# Altium footprint library AD_Lib.PcbLib: 508 footprints (part 7 of 32)
Each footprint in its own frame and in the unit in brackets; x right, y up, seen from the top. Pads: shape width x height; smd on the part's side, far side on the other; paste and mask are expansions set on the pad; w line width, h text height; cw(c..) or ccw(c..) is an arc to the next point about the centre after c.
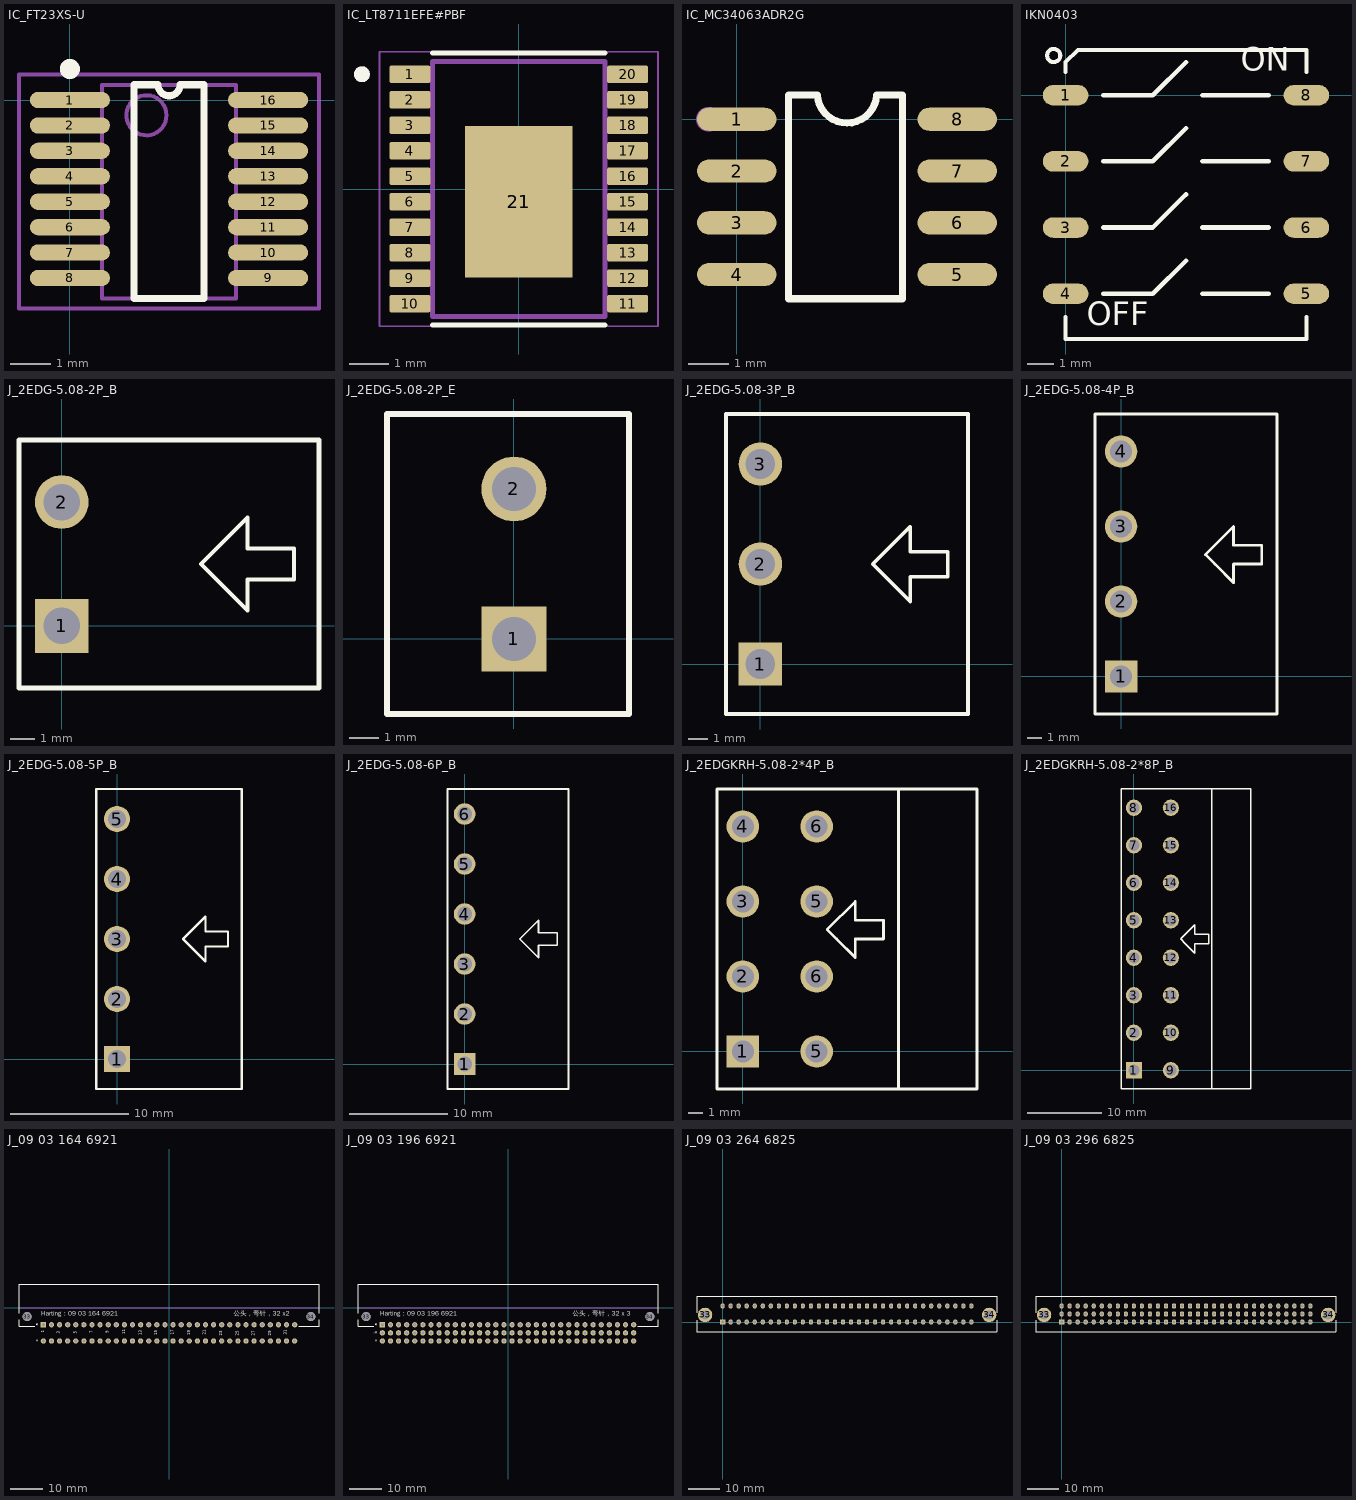
[diagram p6: the footprints below, top view; thin cyan lines are the x and y axes]

## IC_FT23XS-U [mil] "SOP, 16-Leads, Body 4.90x3.91mm, Pitch 0.635mm"
height 53
pads (16):
  oval 78.74x16 smd: 1(0,0) 2(0,-25) 3(0,-50) 4(0,-75) 5(0,-100) 6(0,-125) 7(0,-150) 8(0,-175) 9(195,-175) 10(195,-150) 11(195,-125) 12(195,-100) 13(195,-75) 14(195,-50) 15(195,-25) 16(195,0)
Top Overlay:
  circle w9.84: c0,30.51 r4.92
  lines w7: 62.99,-195 62.99,15 86.69,15 ccw(c97.52,15) 108.35,15 132.01,15 132.01,-195 62.99,-195
Mechanical 13:
  circle w3.94: c75.31,-15 r19.68
  lines w3.94: 31.5,-195 163.5,-195 163.5,15 31.5,15 31.5,-195
Mechanical 15:
  lines w3.94: -50,-205 -50,25 245,25 245,-205 -50,-205
3D body: height 78.35, standoff 0, extent 31.5,-195 164.88,15

## IC_LT8711EFE#PBF [mm] "FE Package 20-Lead Plastic TSSOP (4.4mm)"
height 1.2
pads (21):
  rrect25% 1.05x0.45 smd: 1(-2.775,2.925) 2(-2.775,2.275) 3(-2.775,1.625) 4(-2.775,0.975) 5(-2.775,0.325) 6(-2.775,-0.325) 7(-2.775,-0.975) 8(-2.775,-1.625) 9(-2.775,-2.275) 10(-2.775,-2.925) 11(2.775,-2.925) 12(2.775,-2.275) 13(2.775,-1.625) 14(2.775,-0.975) 15(2.775,-0.325) 16(2.775,0.325) 17(2.775,0.975) 18(2.775,1.625) 19(2.775,2.275) 20(2.775,2.925)
  rect 2.74x3.86 smd paste-3: 21(0,-0.325)
Top Overlay:
  circle w0.2: c-4,2.925 r0.1
  lines w0.127: -2.2,-3.47 2.2,-3.47 ; -2.2,3.47 2.2,3.47
Top Paste:
  region: 0.96,-1.36 -0.96,-1.36 -0.96,1.36 0.96,1.36
Mechanical 13:
  circle w0.2: c-4,2.925 r0.1
  lines w0.127: -2.2,-3.25 -2.2,3.25 2.2,3.25 2.2,-3.25 -2.2,-3.25
Mechanical 15:
  lines w0.05: -3.55,-3.5 -3.55,3.5 3.55,3.5 3.55,-3.5 -3.55,-3.5
3D body "step_temp.STEP": height 1.2, standoff 0, extent -3.2,-3.25 3.2,3.25

## IC_MC34063ADR2G [mil] "宽体SO8,体宽150mil"
height 68.9
pads (8):
  oval 76.78x22.38 smd: 1(0,0) 2(0,-50) 3(0,-100) 4(0,-150) 5(213,-150) 6(213,-100) 7(213,-50) 8(213,0)
Top Overlay:
  lines w7: 77.89,23.43 50,23.43 50,-173.43 160,-173.43 160,23.43 135.09,23.43 ; 77.89,23.43 ccw(c106.5,24.99) 135.09,23.23
Mechanical 15:
  circle w11.81: c-27.36,0 r5.91

## IKN0403 [mil] "Apem之IKN系列播码开关，4bit"
height 59.06
pads (8):
  oval 69x31 smd: 1(0,0) 2(0,-100) 3(0,-200) 4(0,-300) 5(364,-300) 6(364,-200) 7(364,-100) 8(364,0)
Top Overlay:
  circle w6: c-18,60 r10
  lines w6: 0,-335 0,-368.5 364,-368.5 364,-335 ; 0,35 0,50 18.5,68.5 364,68.5 364,35
  lines w7: 57,-300 132,-300 182,-250 ; 57,-200 132,-200 182,-150 ; 57,-100 132,-100 182,-50 ; 57,0 132,0 182,50 ; 207,-300 307,-300 ; 207,-200 307,-200 ; 207,-100 307,-100 ; 207,0 307,0
  text "ON" at 265,25 h60
  text "OFF" at 32,-360 h60

## J_2EDG-5.08-2P_B [mm] "2EDG-5.08插拔式接线端子，弯针座；（凤凰端子）"
height 10
pads (2):
  rect 2.2x2.2 hole 1.5: 1(0,0)
  round 2.2 hole 1.5: 2(0,5.08)
Top Overlay:
  lines w0.178: 5.715,2.54 7.62,4.445 7.62,3.175 9.525,3.175 9.525,1.905 7.62,1.905 7.62,0.635 6.35,1.905 5.715,2.54
  lines w0.203: -1.75,-2.54 -1.75,7.62 10.55,7.62 10.55,-2.54 -1.75,-2.54

## J_2EDG-5.08-2P_E [mm] "2EDG-5.08插拔式接线端子，直针座；（凤凰端子）"
height 10
pads (2):
  rect 2.2x2.2 hole 1.5: 1(0,0)
  round 2.2 hole 1.5: 2(0,5.08)
Top Overlay:
  lines w0.203: -4.3,-2.54 3.9,-2.54 3.9,7.62 -4.3,7.62 -4.3,-2.54

## J_2EDG-5.08-3P_B [mm] "2EDG-5.08插拔式接线端子，弯针座；（凤凰端子）"
height 10
pads (3):
  rect 2.2x2.2 hole 1.5: 1(0,0)
  round 2.2 hole 1.5: 2(0,5.08) 3(0,10.16)
Top Overlay:
  lines w0.178: 5.715,5.08 7.62,6.985 7.62,5.715 9.525,5.715 9.525,4.445 7.62,4.445 7.62,3.175 6.35,4.445 5.715,5.08
  lines w0.203: -1.75,-2.54 -1.75,12.7 10.55,12.7 10.55,-2.54 -1.75,-2.54

## J_2EDG-5.08-4P_B [mm] "2EDG-5.08插拔式接线端子，弯针座；（凤凰端子）"
height 10
pads (4):
  rect 2.2x2.2 hole 1.5: 1(0,0)
  round 2.2 hole 1.5: 2(0,5.08) 3(0,10.16) 4(0,15.24)
Top Overlay:
  lines w0.178: 5.715,8.255 7.62,10.16 7.62,8.89 9.525,8.89 9.525,7.62 7.62,7.62 7.62,6.35 6.35,7.62 5.715,8.255
  lines w0.203: -1.75,-2.54 10.55,-2.54 10.55,17.78 -1.75,17.78 -1.75,-2.54

## J_2EDG-5.08-5P_B [mm] "2EDG-5.08插拔式接线端子，弯针座；（凤凰端子）"
height 10
pads (5):
  rect 2.2x2.2 hole 1.5: 1(0,0)
  round 2.2 hole 1.5: 2(0,5.08) 3(0,10.16) 4(0,15.24) 5(0,20.32)
Top Overlay:
  lines w0.178: 5.588,10.16 6.223,9.525 7.493,8.255 7.493,9.525 9.398,9.525 9.398,10.795 7.493,10.795 7.493,12.065 5.588,10.16
  lines w0.203: -1.75,-2.54 10.55,-2.54 10.55,22.86 -1.75,22.86 -1.75,-2.54

## J_2EDG-5.08-6P_B [mm] "2EDG-5.08插拔式接线端子，弯针座；（凤凰端子）"
height 10
pads (6):
  rect 2.2x2.2 hole 1.5: 1(0,0)
  round 2.2 hole 1.5: 2(0,5.08) 3(0,10.16) 4(0,15.24) 5(0,20.32) 6(0,25.4)
Top Overlay:
  lines w0.178: 5.588,12.7 7.493,14.605 7.493,13.335 9.398,13.335 9.398,12.065 7.493,12.065 7.493,10.795 6.223,12.065 5.588,12.7
  lines w0.203: -1.75,-2.54 10.55,-2.54 10.55,27.94 -1.75,27.94 -1.75,-2.54

## J_2EDGKRH-5.08-2*4P_B [mm] "2EDG-5.08插拔式接线端子，弯针座，双排；（凤凰端子）"
height 20.1
pads (8):
  rect 2.2x2.2 hole 1.5: 1(0,0)
  round 2.2 hole 1.5: 2(0,5.08) 3(0,10.16) 4(0,15.24) 5(5,0) 5(5,10.16) 6(5,5.08) 6(5,15.24)
Top Overlay:
  lines w0.178: 5.715,8.255 6.35,7.62 7.62,6.35 7.62,7.62 9.525,7.62 9.525,8.89 7.62,8.89 7.62,10.16 5.715,8.255
  lines w0.203: 10.55,-2.54 10.55,17.78 ; 15.822,-2.54 -1.75,-2.54 -1.75,17.78 15.822,17.78 ; 15.859,-2.54 15.859,17.78

## J_2EDGKRH-5.08-2*8P_B [mm] "2EDG-5.08插拔式接线端子，弯针座，双排；（凤凰端子）"
height 20.1
pads (16):
  rect 2.2x2.2 hole 1.5: 1(0,0)
  round 2.2 hole 1.5: 2(0,5.08) 3(0,10.16) 4(0,15.24) 5(0,20.32) 6(0,25.4) 7(0,30.48) 8(0,35.56) 9(5,0) 10(5,5.08) 11(5,10.16) 12(5,15.24) 13(5,20.32) 14(5,25.4) 15(5,30.48) 16(5,35.56)
Top Overlay:
  lines w0.178: 6.35,17.78 6.985,17.145 8.255,15.875 8.255,17.145 10.16,17.145 10.16,18.415 8.255,18.415 8.255,19.685 6.35,17.78
  lines w0.203: 10.55,-2.54 10.55,38.1 ; 15.822,-2.54 -1.75,-2.54 -1.75,38.1 15.822,38.1 ; 15.859,-2.54 15.859,38.1

## J_09 03 164 6921 [mm] "哈丁背板接头，公头，64P"
height 11.1
pads (66):
  round 2.8 hole 2.8: 33(-44.45,-2.76) 34(44.45,-2.76)
  rect 1.65x1.65 hole 1: A1(-39.37,-5.3)
  round 1.65 hole 1: A2(-36.83,-5.3) A3(-34.29,-5.3) A4(-31.75,-5.3) A5(-29.21,-5.3) A6(-26.67,-5.3) A7(-24.13,-5.3) A8(-21.59,-5.3) A9(-19.05,-5.3) A10(-16.51,-5.3) A11(-13.97,-5.3) A12(-11.43,-5.3) A13(-8.89,-5.3) A14(-6.35,-5.3) A15(-3.81,-5.3) A16(-1.27,-5.3) A17(1.27,-5.3) A18(3.81,-5.3) A19(6.35,-5.3) A20(8.89,-5.3) A21(11.43,-5.3) A22(13.97,-5.3) A23(16.51,-5.3) A24(19.05,-5.3) A25(21.59,-5.3) A26(24.13,-5.3) A27(26.67,-5.3) A28(29.21,-5.3) A29(31.75,-5.3) A30(34.29,-5.3) A31(36.83,-5.3) A32(39.37,-5.3) C1(-39.37,-10.38) C2(-36.83,-10.38) C3(-34.29,-10.38) C4(-31.75,-10.38) C5(-29.21,-10.38) C6(-26.67,-10.38) C7(-24.13,-10.38) C8(-21.59,-10.38) C9(-19.05,-10.38) C10(-16.51,-10.38) C11(-13.97,-10.38) C12(-11.43,-10.38) C13(-8.89,-10.38) C14(-6.35,-10.38) C15(-3.81,-10.38) C16(-1.27,-10.38) C17(1.27,-10.38) C18(3.81,-10.38) C19(6.35,-10.38) C20(8.89,-10.38) C21(11.43,-10.38) C22(13.97,-10.38) C23(16.51,-10.38) C24(19.05,-10.38) C25(21.59,-10.38) C26(24.13,-10.38) C27(26.67,-10.38) C28(29.21,-10.38) C29(31.75,-10.38) C30(34.29,-10.38) C31(36.83,-10.38) C32(39.37,-10.38)
Top Overlay:
  lines w0.2: -47,-3.76 -47,-5.8 -42.07,-5.8 ; -47,-1.76 -47,7.34 47,7.34 47,-1.76 ; 40.595,-5.8 47,-5.8 47,-3.76
  text "公头，弯针，32 x2" at 20.32,-3.175 h2.54
  text "a" at -40.716,-5.619 h1.52
  text "c" at -40.716,-10.699 h1.52
  text "1" at -38.811,-7.812 h1.52
  text "3" at -33.858,-8.193 h1.52
  text "5" at -28.651,-8.066 h1.52
  text "7" at -23.571,-7.939 h1.52
  text "9" at -18.618,-7.939 h1.52
  text "11" at -13.411,-8.32 h1.52
  text "13" at -8.204,-8.574 h1.52
  text "15" at -3.378,-8.574 h1.52
  text "17" at 1.829,-8.447 h1.52
  text "19" at 6.909,-8.574 h1.52
  text "21" at 11.862,-8.447 h1.52
  text "23" at 17.069,-8.701 h1.52
  text "25" at 22.149,-8.701 h1.52
  text "27" at 27.229,-8.701 h1.52
  text "29" at 32.309,-8.701 h1.52
  text "31" at 37.262,-8.447 h1.52
  text "Harting：09 03 164 6921" at -40.005,-3.175 h2.54
Bottom Overlay:
  text "a" at 41.453,-4.857 h1.52
  text "c" at 41.58,-10.191 h1.52
  text "1" at -38.811,-7.651 h1.52
  text "3" at -33.731,-7.397 h1.52
  text "5" at -28.651,-7.397 h1.52
  text "7" at -23.571,-7.524 h1.52
  text "9" at -18.491,-7.397 h1.52
  text "11" at -13.411,-7.143 h1.52
  text "13" at -8.331,-6.762 h1.52
  text "15" at -3.378,-6.762 h1.52
  text "17" at 1.829,-6.889 h1.52
  text "19" at 6.782,-6.889 h1.52
  text "21" at 11.862,-7.016 h1.52
  text "23" at 17.196,-7.016 h1.52
  text "25" at 22.149,-7.016 h1.52
  text "27" at 27.229,-7.016 h1.52
  text "29" at 32.182,-7.016 h1.52
  text "31" at 37.262,-7.016 h1.52
Mechanical 1:
  lines w0.1: -47,0 47,0
  text "PCB Edge" at -46.431,1.366 h1.52

## J_09 03 196 6921 [mm] "哈丁背板接头，公头，96P"
height 11.1
pads (98):
  round 2.8 hole 2.8: 33(-44.45,-2.76) 34(44.45,-2.76)
  rect 1.65x1.65 hole 1: A1(-39.37,-5.3)
  round 1.65 hole 1: A2(-36.83,-5.3) A3(-34.29,-5.3) A4(-31.75,-5.3) A5(-29.21,-5.3) A6(-26.67,-5.3) A7(-24.13,-5.3) A8(-21.59,-5.3) A9(-19.05,-5.3) A10(-16.51,-5.3) A11(-13.97,-5.3) A12(-11.43,-5.3) A13(-8.89,-5.3) A14(-6.35,-5.3) A15(-3.81,-5.3) A16(-1.27,-5.3) A17(1.27,-5.3) A18(3.81,-5.3) A19(6.35,-5.3) A20(8.89,-5.3) A21(11.43,-5.3) A22(13.97,-5.3) A23(16.51,-5.3) A24(19.05,-5.3) A25(21.59,-5.3) A26(24.13,-5.3) A27(26.67,-5.3) A28(29.21,-5.3) A29(31.75,-5.3) A30(34.29,-5.3) A31(36.83,-5.3) A32(39.37,-5.3) B1(-39.37,-7.84) B2(-36.83,-7.84) B3(-34.29,-7.84) B4(-31.75,-7.84) B5(-29.21,-7.84) B6(-26.67,-7.84) B7(-24.13,-7.84) B8(-21.59,-7.84) B9(-19.05,-7.84) B10(-16.51,-7.84) B11(-13.97,-7.84) B12(-11.43,-7.84) B13(-8.89,-7.84) B14(-6.35,-7.84) B15(-3.81,-7.84) B16(-1.27,-7.84) B17(1.27,-7.84) B18(3.81,-7.84) B19(6.35,-7.84) B20(8.89,-7.84) B21(11.43,-7.84) B22(13.97,-7.84) B23(16.51,-7.84) B24(19.05,-7.84) B25(21.59,-7.84) B26(24.13,-7.84) B27(26.67,-7.84) B28(29.21,-7.84) B29(31.75,-7.84) B30(34.29,-7.84) B31(36.83,-7.84) B32(39.37,-7.84) C1(-39.37,-10.38) C2(-36.83,-10.38) C3(-34.29,-10.38) C4(-31.75,-10.38) C5(-29.21,-10.38) C6(-26.67,-10.38) C7(-24.13,-10.38) C8(-21.59,-10.38) C9(-19.05,-10.38) C10(-16.51,-10.38) C11(-13.97,-10.38) C12(-11.43,-10.38) C13(-8.89,-10.38) C14(-6.35,-10.38) C15(-3.81,-10.38) C16(-1.27,-10.38) C17(1.27,-10.38) C18(3.81,-10.38) C19(6.35,-10.38) C20(8.89,-10.38) C21(11.43,-10.38) C22(13.97,-10.38) C23(16.51,-10.38) C24(19.05,-10.38) C25(21.59,-10.38) C26(24.13,-10.38) C27(26.67,-10.38) C28(29.21,-10.38) C29(31.75,-10.38) C30(34.29,-10.38) C31(36.83,-10.38) C32(39.37,-10.38)
Top Overlay:
  lines w0.2: -47,-3.76 -47,-5.8 -42.07,-5.8 ; -47,-1.76 -47,7.34 47,7.34 47,-1.76 ; 40.595,-5.8 47,-5.8 47,-3.76
  text "公头，弯针，32 x 3" at 20.32,-3.175 h2.54
  text "Harting：09 03 196 6921" at -40.005,-3.175 h2.54
  text "a" at -40.716,-5.619 h1.52
  text "c" at -40.716,-10.699 h1.52
  text "b" at -40.716,-8.159 h1.52
Bottom Overlay:
  text "31" at 37.338,-2.794 h1.52
  text "a" at 41.453,-4.857 h1.52
  text "c" at 41.58,-10.191 h1.52
  text "30" at 34.798,-2.794 h1.52
  text "29" at 32.258,-2.794 h1.52
  text "28" at 29.718,-2.794 h1.52
  text "27" at 27.178,-2.794 h1.52
  text "26" at 24.638,-2.794 h1.52
  text "25" at 22.098,-2.794 h1.52
  text "24" at 19.558,-2.794 h1.52
  text "23" at 17.018,-2.794 h1.52
  text "22" at 14.478,-2.794 h1.52
  text "21" at 11.938,-2.794 h1.52
  text "20" at 9.398,-2.794 h1.52
  text "19" at 6.858,-2.794 h1.52
  text "18" at 4.318,-2.794 h1.52
  text "17" at 1.778,-2.794 h1.52
  text "16" at -0.762,-2.794 h1.52
  text "15" at -3.302,-2.794 h1.52
  text "14" at -5.842,-2.794 h1.52
  text "13" at -8.382,-2.794 h1.52
  text "12" at -10.922,-2.794 h1.52
  text "11" at -13.462,-2.794 h1.52
  text "10" at -16.002,-2.794 h1.52
  text "9" at -18.542,-2.794 h1.52
  text "8" at -21.082,-2.794 h1.52
  text "7" at -23.622,-2.794 h1.52
  text "6" at -26.162,-2.794 h1.52
  text "5" at -28.702,-2.794 h1.52
  text "4" at -31.242,-2.794 h1.52
  text "3" at -33.782,-2.794 h1.52
  text "2" at -36.322,-2.794 h1.52
  text "1" at -38.862,-2.794 h1.52
  text "32" at 39.878,-2.794 h1.52
Mechanical 1:
  lines w0.1: -47,0 47,0
  text "PCB Edge" at -46.431,1.366 h1.52

## J_09 03 264 6825 [mm] "Connector; DIN 41612, Type R, Thru-Hole; Rows a+c, 64 Position; Vertical"
height 11.6
pads (66):
  round 4.6 hole 2.8: 33(-5.588,2.235) 34(84.37,2.235)
  rect 1.65x1.65 hole 1: A1(0,0)
  oval 1.3x1.7 hole 1: A2(2.54,0) A3(5.08,0) A4(7.62,0) A5(10.16,0) A6(12.7,0) A7(15.24,0) A8(17.78,0) A9(20.32,0) A10(22.86,0) A11(25.4,0) A12(27.94,0) A13(30.48,0) A14(33.02,0) A15(35.56,0) A16(38.1,0) A17(40.64,0) A18(43.18,0) A19(45.72,0) A20(48.26,0) A21(50.8,0) A22(53.34,0) A23(55.88,0) A24(58.42,0) A25(60.96,0) A26(63.5,0) A27(66.04,0) A28(68.58,0) A29(71.12,0) A30(73.66,0) A31(76.2,0) A32(78.74,0) C1(0,5.08) C2(2.54,5.08) C3(5.08,5.08) C4(7.62,5.08) C5(10.16,5.08) C6(12.7,5.08) C7(15.24,5.08) C8(17.78,5.08) C9(20.32,5.08) C10(22.86,5.08) C11(25.4,5.08) C12(27.94,5.08) C13(30.48,5.08) C14(33.02,5.08) C15(35.56,5.08) C16(38.1,5.08) C17(40.64,5.08) C18(43.18,5.08) C19(45.72,5.08) C20(48.26,5.08) C21(50.8,5.08) C22(53.34,5.08) C23(55.88,5.08) C24(58.42,5.08) C25(60.96,5.08) C26(63.5,5.08) C27(66.04,5.08) C28(68.58,5.08) C29(71.12,5.08) C30(73.66,5.08) C31(76.2,5.08) C32(78.74,5.08)
Top Overlay:
  lines w0.2: -8.13,0.61 -8.13,-3.01 86.87,-3.01 86.87,0.61 ; -8.13,3.01 -8.13,8.09 86.87,8.09 86.87,3.01
Bottom Overlay:
  text "1" at 0.254,-2.54 h1.5
  text "2" at 2.794,-2.54 h1.5
  text "3" at 5.334,-2.54 h1.5
  text "4" at 7.874,-2.54 h1.5
  text "5" at 10.414,-2.54 h1.5
  text "6" at 12.954,-2.54 h1.5
  text "7" at 15.494,-2.54 h1.5
  text "10" at 23.368,-2.54 h1.5
  text "9" at 20.574,-2.54 h1.5
  text "8" at 18.034,-2.54 h1.5
  text "11" at 25.908,-2.54 h1.5
  text "12" at 28.448,-2.54 h1.5
  text "13" at 30.988,-2.54 h1.5
  text "14" at 33.528,-2.54 h1.5
  text "15" at 36.068,-2.54 h1.5
  text "16" at 38.608,-2.54 h1.5
  text "17" at 41.148,-2.54 h1.5
  text "18" at 43.688,-2.54 h1.5
  text "19" at 46.228,-2.54 h1.5
  text "20" at 48.768,-2.54 h1.5
  text "21" at 51.308,-2.54 h1.5
  text "22" at 53.848,-2.54 h1.5
  text "23" at 56.388,-2.54 h1.5
  text "24" at 58.928,-2.54 h1.5
  text "25" at 61.468,-2.54 h1.5
  text "26" at 64.008,-2.54 h1.5
  text "27" at 66.548,-2.54 h1.5
  text "28" at 69.088,-2.54 h1.5
  text "29" at 71.628,-2.54 h1.5
  text "30" at 74.168,-2.54 h1.5
  text "31" at 76.708,-2.54 h1.5
  text "32" at 79.248,-2.54 h1.5
  text "a" at -1.651,-0.508 h1.5
  text "c" at -1.651,4.572 h1.5

## J_09 03 296 6825 [mm] "Connector; DIN 41612, Type R, Thru-Hole; Rows a+b+c, 96 Position; Vertical"
height 11.6
pads (98):
  round 4.6 hole 2.8: 33(-5.588,2.235) 34(84.37,2.235)
  rect 1.65x1.65 hole 1: A1(0,0)
  oval 1.3x1.7 hole 1: A2(2.54,0) A3(5.08,0) A4(7.62,0) A5(10.16,0) A6(12.7,0) A7(15.24,0) A8(17.78,0) A9(20.32,0) A10(22.86,0) A11(25.4,0) A12(27.94,0) A13(30.48,0) A14(33.02,0) A15(35.56,0) A16(38.1,0) A17(40.64,0) A18(43.18,0) A19(45.72,0) A20(48.26,0) A21(50.8,0) A22(53.34,0) A23(55.88,0) A24(58.42,0) A25(60.96,0) A26(63.5,0) A27(66.04,0) A28(68.58,0) A29(71.12,0) A30(73.66,0) A31(76.2,0) A32(78.74,0) B1(0,2.54) B2(2.54,2.54) B3(5.08,2.54) B4(7.62,2.54) B5(10.16,2.54) B6(12.7,2.54) B7(15.24,2.54) B8(17.78,2.54) B9(20.32,2.54) B10(22.86,2.54) B11(25.4,2.54) B12(27.94,2.54) B13(30.48,2.54) B14(33.02,2.54) B15(35.56,2.54) B16(38.1,2.54) B17(40.64,2.54) B18(43.18,2.54) B19(45.72,2.54) B20(48.26,2.54) B21(50.8,2.54) B22(53.34,2.54) B23(55.88,2.54) B24(58.42,2.54) B25(60.96,2.54) B26(63.5,2.54) B27(66.04,2.54) B28(68.58,2.54) B29(71.12,2.54) B30(73.66,2.54) B31(76.2,2.54) B32(78.74,2.54) C1(0,5.08) C2(2.54,5.08) C3(5.08,5.08) C4(7.62,5.08) C5(10.16,5.08) C6(12.7,5.08) C7(15.24,5.08) C8(17.78,5.08) C9(20.32,5.08) C10(22.86,5.08) C11(25.4,5.08) C12(27.94,5.08) C13(30.48,5.08) C14(33.02,5.08) C15(35.56,5.08) C16(38.1,5.08) C17(40.64,5.08) C18(43.18,5.08) C19(45.72,5.08) C20(48.26,5.08) C21(50.8,5.08) C22(53.34,5.08) C23(55.88,5.08) C24(58.42,5.08) C25(60.96,5.08) C26(63.5,5.08) C27(66.04,5.08) C28(68.58,5.08) C29(71.12,5.08) C30(73.66,5.08) C31(76.2,5.08) C32(78.74,5.08)
Top Overlay:
  lines w0.2: -8.13,0.61 -8.13,-3.01 86.87,-3.01 86.87,0.61 ; -8.13,3.01 -8.13,8.09 86.87,8.09 86.87,3.01
Bottom Overlay:
  text "1" at 0.254,-2.54 h1.5
  text "2" at 2.794,-2.54 h1.5
  text "3" at 5.334,-2.54 h1.5
  text "4" at 7.874,-2.54 h1.5
  text "5" at 10.414,-2.54 h1.5
  text "6" at 12.954,-2.54 h1.5
  text "7" at 15.494,-2.54 h1.5
  text "10" at 23.368,-2.54 h1.5
  text "9" at 20.574,-2.54 h1.5
  text "8" at 18.034,-2.54 h1.5
  text "11" at 25.908,-2.54 h1.5
  text "12" at 28.448,-2.54 h1.5
  text "13" at 30.988,-2.54 h1.5
  text "14" at 33.528,-2.54 h1.5
  text "15" at 36.068,-2.54 h1.5
  text "16" at 38.608,-2.54 h1.5
  text "17" at 41.148,-2.54 h1.5
  text "18" at 43.688,-2.54 h1.5
  text "19" at 46.228,-2.54 h1.5
  text "20" at 48.768,-2.54 h1.5
  text "21" at 51.308,-2.54 h1.5
  text "22" at 53.848,-2.54 h1.5
  text "23" at 56.388,-2.54 h1.5
  text "24" at 58.928,-2.54 h1.5
  text "25" at 61.468,-2.54 h1.5
  text "26" at 64.008,-2.54 h1.5
  text "27" at 66.548,-2.54 h1.5
  text "28" at 69.088,-2.54 h1.5
  text "29" at 71.628,-2.54 h1.5
  text "30" at 74.168,-2.54 h1.5
  text "31" at 76.708,-2.54 h1.5
  text "32" at 79.248,-2.54 h1.5
  text "a" at -1.651,-0.508 h1.5
  text "c" at -1.651,4.572 h1.5
  text "b" at -1.651,2.032 h1.5